# Altium footprint library texas.PCBLIB: 168 footprints (part 8 of 14)
Each footprint in its own frame and in the unit in brackets; x right, y up, seen from the top. Pads: shape width x height; smd on the part's side, far side on the other; paste and mask are expansions set on the pad; w line width, h text height; cw(c..) or ccw(c..) is an arc to the next point about the centre after c.
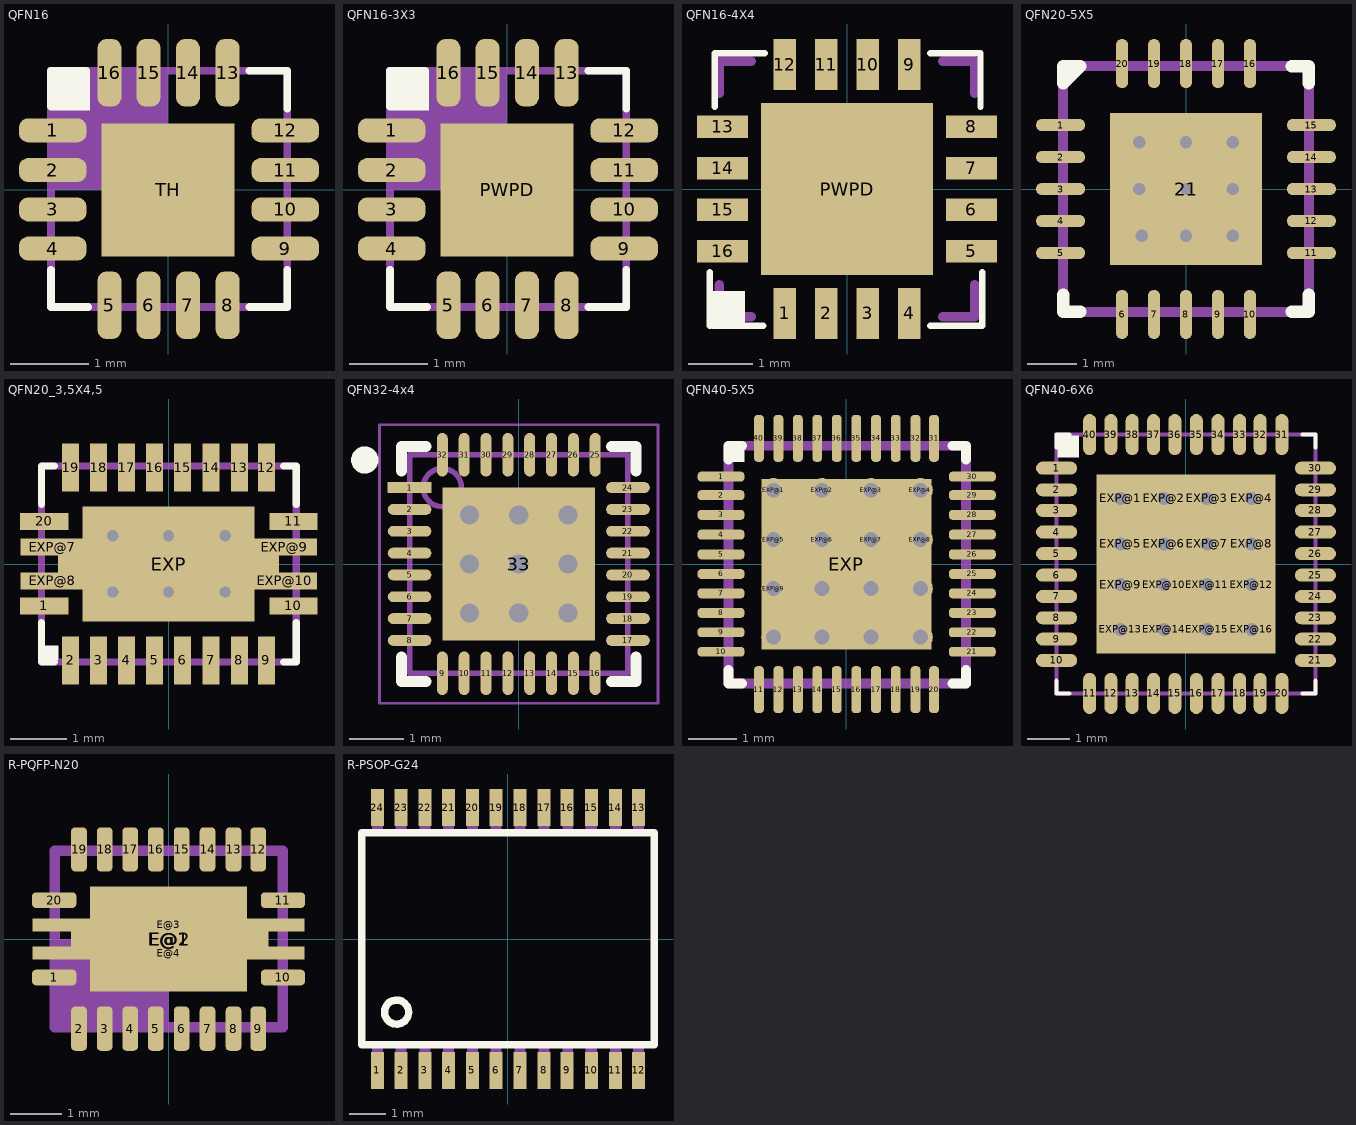
[diagram p7: the footprints below, top view; thin cyan lines are the x and y axes]

## QFN16 [mil]
pads (17):
  rrect75% 34x12 smd: 1(-58.07,30) 2(-58.07,10) 3(-58.07,-9.84) 4(-58.07,-29.53) 9(59,-29.53) 10(59,-9.84) 11(59,10) 12(59,30)
  rrect75% 12x34 smd: 5(-29.53,-58.07) 6(-9.84,-58.07) 7(10,-58.07) 8(30,-58.07) 13(30,59) 14(10,59) 15(-9.84,59) 16(-29.53,59)
  rect 67x67 smd: TH(0,0)
Top Overlay:
  rectangle: -59.06,40 -39.37,60
  lines w4: -59.06,-40.35 -59.06,-59.06 -40.35,-59.06 ; -59.06,42 -59.06,60 -41.34,60 ; 41,-59.06 60,-59.06 60,-40.35 ; 41,60 60,60 60,41
Top Paste:
  circle w0: c-47.24,30 r5
  circle w0: c-47.24,10 r5
  circle w0: c-47.24,-9.84 r5
  circle w0: c-47.24,-29.53 r5
  circle w0: c-29.53,-47.24 r5
  circle w0: c-9.84,-47.24 r5
  circle w0: c10,-47.24 r5
  circle w0: c30,-47.24 r5
  circle w0: c48,-29.53 r5
  circle w0: c48,-9.84 r5
  circle w0: c48,10 r5
  circle w0: c48,30 r5
  circle w0: c30,48 r5
  circle w0: c10,48 r5
  circle w0: c-9.84,48 r5
  circle w0: c-29.53,48 r5
  region: -3.72,4.22 -3.72,31.78 -31.72,31.78 -31.72,4.22
  rectangle: -72.83,25 -47.24,35
  rectangle: -72.83,5 -47.24,15
  rectangle: -72.83,-14.76 -47.24,-4.92
  rectangle: -72.83,-34.45 -47.24,-24.61
  region: -24.61,-72.83 -24.61,-47.24 -34.45,-47.24 -34.45,-72.83
  region: -4.9,-72.86 -4.9,-47.22 -14.74,-47.22 -14.74,-72.86
  region: 14.94,-73.02 14.94,-47.06 5.1,-47.06 5.1,-73.02
  region: 34.92,-73.04 34.92,-47.04 25.08,-47.04 25.08,-73.04
  region: 73,-24.61 48,-24.61 48,-34.45 73,-34.45
  region: 73,-4.92 48,-4.92 48,-14.76 73,-14.76
  region: 73,15 48,15 48,5 73,5
  region: 73,35 48,35 48,25 73,25
  region: 25.5,73.5 25.5,47.5 34.5,47.5 34.5,73.5
  region: 5.52,73.48 5.52,47.52 14.52,47.52 14.52,73.48
  region: -14.32,73.32 -14.32,47.68 -5.32,47.68 -5.32,73.32
  region: -34.03,73.3 -34.03,47.7 -25.03,47.7 -25.03,73.3
  region: -3.94,-3.94 -31.5,-3.94 -31.5,-31.5 -3.94,-31.5
  region: 4.22,-3.72 4.22,-31.72 31.78,-31.72 31.78,-3.72
  rectangle: 4,4 32,32
Top Solder:
  circle w0: c-47.24,30 r8
  circle w0: c-47.24,10 r8
  circle w0: c-47.24,-9.84 r8
  circle w0: c-47.24,-29.53 r8
  circle w0: c-29.53,-47.24 r8
  circle w0: c-9.84,-47.24 r8
  circle w0: c10,-47.24 r8
  circle w0: c30,-47.24 r8
  circle w0: c48,-29.53 r8
  circle w0: c48,-9.84 r8
  circle w0: c48,10 r8
  circle w0: c48,30 r8
  circle w0: c30,48 r8
  circle w0: c10,48 r8
  circle w0: c-9.84,48 r8
  circle w0: c-29.53,48 r8
  rectangle: -34.45,-34.45 35,35
  rectangle: -74.8,22 -47.24,38
  rectangle: -74.8,2 -47.24,18
  rectangle: -74.8,-17.72 -47.24,-1.97
  rectangle: -74.8,-37.4 -47.24,-21.65
  region: -21.65,-74.8 -21.65,-47.24 -37.4,-47.24 -37.4,-74.8
  region: -1.94,-74.83 -1.94,-47.21 -17.68,-47.21 -17.68,-74.83
  region: 17.91,-74.99 17.91,-47.06 2.16,-47.06 2.16,-74.99
  region: 37.87,-75.02 37.87,-47.02 22.13,-47.02 22.13,-75.02
  region: 75,-21.65 48,-21.65 48,-37.4 75,-37.4
  region: 75,-1.97 48,-1.97 48,-17.72 75,-17.72
  region: 75,18 48,18 48,2 75,2
  region: 75,38 48,38 48,22 75,22
  region: 22.5,75.5 22.5,47.5 37.5,47.5 37.5,75.5
  region: 2.53,75.47 2.53,47.53 17.53,47.53 17.53,75.47
  region: -17.31,75.31 -17.31,47.69 -2.31,47.69 -2.31,75.31
  region: -37.03,75.28 -37.03,47.72 -22.03,47.72 -22.03,75.28
Mechanical 4:
  rectangle: -59.06,0 0,60
  lines w4: -59.06,-59.06 60,-59.06 60,60 -59.06,60 -59.06,-59.06
Mechanical 14:
  circle w1: c0,0 r6
  circle w1: c20,20 r6
  circle w1: c20,-19.68 r6
  circle w1: c-19.68,-19.68 r6
  circle w1: c-19.68,20 r6

## QFN16-3X3 [mil]
pads (17):
  rrect75% 34x12 smd: 1(-58.07,30) 2(-58.07,10) 3(-58.07,-9.84) 4(-58.07,-29.53) 9(59,-29.53) 10(59,-9.84) 11(59,10) 12(59,30)
  rrect75% 12x34 smd: 5(-29.53,-58.07) 6(-9.84,-58.07) 7(10,-58.07) 8(30,-58.07) 13(30,59) 14(10,59) 15(-9.84,59) 16(-29.53,59)
  rect 67x67 smd: PWPD(0,0)
Top Overlay:
  rectangle: -59.06,40 -39.37,60
  lines w4: -59.06,-40.35 -59.06,-59.06 -40.35,-59.06 ; -59.06,42 -59.06,60 -41.34,60 ; 41,-59.06 60,-59.06 60,-40.35 ; 41,60 60,60 60,41
Top Paste:
  circle w0: c-29.53,48 r5
  circle w0: c-9.84,48 r5
  circle w0: c10,48 r5
  circle w0: c30,48 r5
  circle w0: c48,30 r5
  circle w0: c48,10 r5
  circle w0: c48,-9.84 r5
  circle w0: c48,-29.53 r5
  circle w0: c30,-47.24 r5
  circle w0: c10,-47.24 r5
  circle w0: c-9.84,-47.24 r5
  circle w0: c-29.53,-47.24 r5
  circle w0: c-47.24,-29.53 r5
  circle w0: c-47.24,-9.84 r5
  circle w0: c-47.24,10 r5
  circle w0: c-47.24,30 r5
  rectangle: 4,4 32,32
  region: 4.22,-3.72 4.22,-31.72 31.78,-31.72 31.78,-3.72
  region: -3.94,-3.94 -31.5,-3.94 -31.5,-31.5 -3.94,-31.5
  region: -34.03,73.3 -34.03,47.7 -25.03,47.7 -25.03,73.3
  region: -14.32,73.32 -14.32,47.68 -5.32,47.68 -5.32,73.32
  region: 5.52,73.48 5.52,47.52 14.52,47.52 14.52,73.48
  region: 25.5,73.5 25.5,47.5 34.5,47.5 34.5,73.5
  region: 73,35 48,35 48,25 73,25
  region: 73,15 48,15 48,5 73,5
  region: 73,-4.92 48,-4.92 48,-14.76 73,-14.76
  region: 73,-24.61 48,-24.61 48,-34.45 73,-34.45
  region: 34.92,-73.04 34.92,-47.04 25.08,-47.04 25.08,-73.04
  region: 14.94,-73.02 14.94,-47.06 5.1,-47.06 5.1,-73.02
  region: -4.9,-72.86 -4.9,-47.22 -14.74,-47.22 -14.74,-72.86
  region: -24.61,-72.83 -24.61,-47.24 -34.45,-47.24 -34.45,-72.83
  rectangle: -72.83,-34.45 -47.24,-24.61
  rectangle: -72.83,-14.76 -47.24,-4.92
  rectangle: -72.83,5 -47.24,15
  rectangle: -72.83,25 -47.24,35
  region: -3.72,4.22 -3.72,31.78 -31.72,31.78 -31.72,4.22
Top Solder:
  circle w0: c-29.53,48 r8
  circle w0: c-9.84,48 r8
  circle w0: c10,48 r8
  circle w0: c30,48 r8
  circle w0: c48,30 r8
  circle w0: c48,10 r8
  circle w0: c48,-9.84 r8
  circle w0: c48,-29.53 r8
  circle w0: c30,-47.24 r8
  circle w0: c10,-47.24 r8
  circle w0: c-9.84,-47.24 r8
  circle w0: c-29.53,-47.24 r8
  circle w0: c-47.24,-29.53 r8
  circle w0: c-47.24,-9.84 r8
  circle w0: c-47.24,10 r8
  circle w0: c-47.24,30 r8
  region: -37.03,75.28 -37.03,47.72 -22.03,47.72 -22.03,75.28
  region: -17.31,75.31 -17.31,47.69 -2.31,47.69 -2.31,75.31
  region: 2.53,75.47 2.53,47.53 17.53,47.53 17.53,75.47
  region: 22.5,75.5 22.5,47.5 37.5,47.5 37.5,75.5
  region: 75,38 48,38 48,22 75,22
  region: 75,18 48,18 48,2 75,2
  region: 75,-1.97 48,-1.97 48,-17.72 75,-17.72
  region: 75,-21.65 48,-21.65 48,-37.4 75,-37.4
  region: 37.87,-75.02 37.87,-47.02 22.13,-47.02 22.13,-75.02
  region: 17.91,-74.99 17.91,-47.06 2.16,-47.06 2.16,-74.99
  region: -1.94,-74.83 -1.94,-47.21 -17.68,-47.21 -17.68,-74.83
  region: -21.65,-74.8 -21.65,-47.24 -37.4,-47.24 -37.4,-74.8
  rectangle: -74.8,-37.4 -47.24,-21.65
  rectangle: -74.8,-17.72 -47.24,-1.97
  rectangle: -74.8,2 -47.24,18
  rectangle: -74.8,22 -47.24,38
  rectangle: -34.45,-34.45 35,35
Mechanical 4:
  rectangle: -59.06,0 0,60
  lines w4: -59.06,-59.06 -59.06,60 60,60 60,-59.06 -59.06,-59.06
Mechanical 14:
  circle w1: c-19.68,20 r6
  circle w1: c-19.68,-19.68 r6
  circle w1: c20,-19.68 r6
  circle w1: c20,20 r6
  circle w1: c0,0 r6
3D body "ALSRobot-QFN16 3x3.STEP": height 35.43, standoff 0, extent -60.99,-59.87 58.77,59.89

## QFN16-4X4 [mil]
pads (17):
  rrect2% 13.78x31.5 smd: 1(-38.39,-76.77) 2(-12.8,-76.77) 3(12.8,-76.77) 4(38.39,-76.77) 9(38.39,76.77) 10(12.8,76.77) 11(-12.8,76.77) 12(-38.39,76.77)
  rrect2% 31.5x13.78 smd: 5(76.77,-38.39) 6(76.77,-12.8) 7(76.77,12.8) 8(76.77,38.39) 13(-76.77,38.39) 14(-76.77,12.8) 15(-76.77,-12.8) 16(-76.77,-38.39)
  rect 106.3x106.3 smd: PWPD(0,0)
Top Overlay:
  region: -62.99,-82.68 -82.68,-82.68 -82.68,-62.99 -62.99,-62.99
  lines w4: -84.66,-84.23 -84.66,-51.23 ; -82.66,-84.23 -51.66,-84.23 ; -81.66,50.77 -81.66,83.77 -50.66,83.77 ; 51.34,-84.23 82.34,-84.23 ; 51.34,83.77 82.34,83.77 82.34,50.77 ; 83.34,-84.23 83.34,-51.23
Top Paste:
  region: 47.24,-47.24 47.24,47.24 -47.24,47.24 -47.24,-39.37 -39.37,-47.24
Top Solder:
  region: 47.24,-47.24 47.24,47.24 -47.24,47.24 -47.24,-39.37 -39.37,-47.24
Mechanical 4:
  region: -62.99,-82.68 -82.68,-82.68 -82.68,-62.99 -62.99,-62.99
  lines w6: -78.74,-68.9 -78.74,-59.06 ; -78.74,59.06 -78.74,78.74 -59.06,78.74 ; -68.9,-78.74 -59.06,-78.74 ; 59.06,-78.74 78.74,-78.74 78.74,-59.06 ; 59.06,78.74 78.74,78.74 78.74,59.06
3D body "ALSRobot-QFN16 4x4.step": height 36.22, standoff 0, extent -78.74,-78.73 78.73,78.75

## QFN20-5X5 [mm]
pads (21):
  oval 1x0.25 smd: 1(-2.55,1.3) 2(-2.55,0.65) 3(-2.55,0) 4(-2.55,-0.65) 5(-2.55,-1.3) 11(2.55,-1.3) 12(2.55,-0.65) 13(2.55,0) 14(2.55,0.65) 15(2.55,1.3)
  oval 0.25x1 smd: 6(-1.3,-2.55) 7(-0.65,-2.55) 8(0,-2.55) 9(0.65,-2.55) 10(1.3,-2.55) 16(1.3,2.55) 17(0.65,2.55) 18(0,2.55) 19(-0.65,2.55) 20(-1.3,2.55)
  rect 3.1x3.1 smd: 21(0,0)
via -0.9,-0.95 diameter 0.508 hole 0.254
via -0.95,0 diameter 0.508 hole 0.254
via 0,-0.95 diameter 0.508 hole 0.254
via 0,0 diameter 0.508 hole 0.254
via 0.95,0 diameter 0.508 hole 0.254
via 0.95,-0.95 diameter 0.508 hole 0.254
via 0,0.95 diameter 0.508 hole 0.254
via 0.95,0.95 diameter 0.508 hole 0.254
via -0.95,0.95 diameter 0.508 hole 0.254
Top Overlay:
  lines w0.254: -2.5,-2.15 -2.5,-2.5 -2.15,-2.5 ; 2.15,-2.5 2.5,-2.5 2.5,-2.15 ; 2.15,2.5 2.5,2.5 2.5,2.15 ; -2.5,2.15 -2.5,2.5 -2.15,2.5 -2.5,2.15
Mechanical 4:
  lines w0.203: -2.5,-2.5 2.5,-2.5 2.5,2.5 -2.5,2.5 -2.5,-2.5
3D body "User Library-PQFN_20_5x5.step": height 0.87, standoff -0.03, extent -2.5,-2.5 2.5,2.5

## QFN20_3,5X4,5 [mil]
pads (33):
  rect 34x12 smd: 1(-87.6,-29.53) 10(88,-29.53) 11(88,30) 20(-87.6,30)
  rect 12x34 smd: 2(-68.9,-67.91) 3(-49.21,-67.91) 4(-29.53,-67.91) 5(-9.84,-67.91) 6(10,-67.91) 7(30,-67.91) 8(50,-67.91) 9(69,-67.91) 12(69,68) 13(50,68) 14(30,68) 15(10,68) 16(-9.84,68) 17(-29.53,68) 18(-49.21,68) 19(-68.9,68)
  rect 121x81 smd: EXP(0,0)
  round 12 hole 8: EXP@1(-39.37,20) EXP@2(0,20) EXP@3(40,20) EXP@4(-39.37,-19.68) EXP@5(0,-19.68) EXP@6(40,-19.68)
  rect 45x12 smd: EXP@7(-81.69,12) EXP@8(-81.69,-11.81) EXP@9(82,12) EXP@10(82,-11.81)
  rect 18x16 smd: EXP@11(-68.9,0) EXP@12(69,0)
Top Overlay:
  rectangle: -87.5,-67.5 -77.5,-57.5
  lines w5: -89.57,-41.1 -89.57,-68.9 -80.43,-68.9 ; -89.57,42 -89.57,69 -80.43,69 ; 81,-68.9 90,-68.9 90,-41.1 ; 81,69 90,69 90,42
Top Paste:
  circle w0: c-68.9,58 r5
  circle w0: c-49.21,58 r5
  circle w0: c-29.53,58 r5
  circle w0: c-9.84,58 r5
  circle w0: c10,58 r5
  circle w0: c30,58 r5
  circle w0: c50,58 r5
  circle w0: c69,58 r5
  circle w0: c-76.77,30 r5
  circle w0: c77,30 r5
  circle w0: c77,-29.53 r5
  circle w0: c-76.77,-29.53 r5
  circle w0: c69,-57.09 r5
  circle w0: c50,-57.09 r5
  circle w0: c30,-57.09 r5
  circle w0: c10,-57.09 r5
  circle w0: c-9.84,-57.09 r5
  circle w0: c-29.53,-57.09 r5
  circle w0: c-49.21,-57.09 r5
  circle w0: c-68.9,-57.09 r5
  rectangle: -57.87,-38.39 -5.91,-5.91
  rectangle: -57.87,6 -5.91,39
  region: 58,-5.91 6,-5.91 6,-38.39 58,-38.39
  region: 58,39 6,39 6,6 58,6
  rectangle: -73.33,58 -64.47,84
  rectangle: -53.64,58 -44.78,84
  rectangle: -33.96,58 -25.1,84
  rectangle: -14.27,58 -5.41,84
  rectangle: 6,58 15,84
  rectangle: 26,58 34,84
  rectangle: 45,58 54,84
  rectangle: 65,58 74,84
  region: -77.06,25.57 -77.06,34.43 -103.06,34.43 -103.06,25.57
  region: 77.5,34.5 77.5,25.5 103.5,25.5 103.5,34.5
  region: 77.21,-25.03 77.21,-34.03 103.79,-34.03 103.79,-25.03
  region: -76.77,-33.96 -76.77,-25.1 -103.35,-25.1 -103.35,-33.96
  region: 74,-57.09 65,-57.09 65,-83.66 74,-83.66
  region: 54,-57.09 45,-57.09 45,-83.66 54,-83.66
  region: 34,-57.09 26,-57.09 26,-83.66 34,-83.66
  region: 15,-57.09 6,-57.09 6,-83.66 15,-83.66
  region: -5.41,-57.09 -14.27,-57.09 -14.27,-83.66 -5.41,-83.66
  region: -25.1,-57.09 -33.96,-57.09 -33.96,-83.66 -25.1,-83.66
  region: -44.78,-57.09 -53.64,-57.09 -53.64,-83.66 -44.78,-83.66
  region: -64.47,-57.09 -73.33,-57.09 -73.33,-83.66 -64.47,-83.66
  region: 104,-7.19 68,-7.18 68,-16.24 104,-16.24
  rectangle: -103.35,-16.24 -67.91,-7.18
  rectangle: -103.35,8 -67.91,17
  region: 104,17 68,17 68,8 104,8
Top Solder:
  circle w0: c-76.77,30 r7
  circle w0: c-68.9,58 r7
  circle w0: c-49.21,58 r7
  circle w0: c-29.53,58 r7
  circle w0: c-9.84,58 r7
  circle w0: c10,58 r7
  circle w0: c30,58 r7
  circle w0: c50,58 r7
  circle w0: c69,58 r7
  circle w0: c77,30 r7
  circle w0: c-76.77,-29.53 r7
  circle w0: c77,-29.53 r7
  circle w0: c69,-57.09 r7
  circle w0: c50,-57.09 r7
  circle w0: c30,-57.09 r7
  circle w0: c10,-57.09 r7
  circle w0: c-9.84,-57.09 r7
  circle w0: c-29.53,-57.09 r7
  circle w0: c-49.21,-57.09 r7
  circle w0: c-68.9,-57.09 r7
  rectangle: -105.31,24 -76.77,36
  region: 105,19 67,19 67,6 105,6
  rectangle: -104.82,6 -66.44,19
  rectangle: -104.82,-18.21 -66.44,-5.41
  region: 105,-5.41 67,-5.41 67,-18.21 105,-18.21
  rectangle: -61.02,-41.34 62,42
  region: -75.4,85.77 -75.4,57.23 -62.4,57.23 -62.4,85.77
  region: -55.71,85.77 -55.71,57.23 -42.71,57.23 -42.71,85.77
  region: -36.03,85.77 -36.03,57.23 -23.03,57.23 -23.03,85.77
  region: -16.06,86.06 -16.06,56.94 -3.06,56.94 -3.06,86.06
  region: 3.79,86.21 3.79,56.79 16.79,56.79 16.79,86.21
  region: 23.5,85.5 23.5,57.5 36.5,57.5 36.5,85.5
  region: 43,86 43,57 56,57 56,86
  region: 63,86 63,57 76,57 76,86
  region: 106,36 77,36 77,24 106,24
  rectangle: -105.31,-35.93 -76.77,-23.13
  region: 106,-23.13 77,-23.13 77,-35.93 106,-35.93
  region: 75.9,-85.86 75.9,-56.86 63.1,-56.86 63.1,-85.86
  region: 55.9,-85.86 55.9,-56.86 43.1,-56.86 43.1,-85.86
  region: 36.4,-85.36 36.4,-57.36 23.6,-57.36 23.6,-85.36
  region: 16.68,-86.07 16.68,-56.64 3.89,-56.64 3.89,-86.07
  region: -3.16,-85.92 -3.16,-56.8 -15.95,-56.8 -15.95,-85.92
  region: -23.13,-85.63 -23.13,-57.09 -35.93,-57.09 -35.93,-85.63
  region: -42.81,-85.63 -42.81,-57.09 -55.61,-57.09 -55.61,-85.63
  region: -62.5,-85.63 -62.5,-57.09 -75.3,-57.09 -75.3,-85.63
Mechanical 4:
  lines w5: -89.57,-68.9 90,-68.9 90,69 -89.57,69 -89.57,-68.9

## QFN32-4x4 [mm] "QFN, 32-Leads, Body 4x4mm, Pitch 0.5mm, Thermal Pad 3.45x3.45mm, IPC Medium Density"
height 1
pads (33):
  rect 0.8x0.2 smd: 1(-2,1.4)
  oval 0.8x0.2 smd: 2(-2,1) 3(-2,0.6) 4(-2,0.2) 5(-2,-0.2) 6(-2,-0.6) 7(-2,-1) 8(-2,-1.4) 17(2,-1.4) 18(2,-1) 19(2,-0.6) 20(2,-0.2) 21(2,0.2) 22(2,0.6) 23(2,1) 24(2,1.4)
  oval 0.2x0.8 smd: 9(-1.4,-2) 10(-1,-2) 11(-0.6,-2) 12(-0.2,-2) 13(0.2,-2) 14(0.6,-2) 15(1,-2) 16(1.4,-2) 25(1.4,2) 26(1,2) 27(0.6,2) 28(0.2,2) 29(-0.2,2) 30(-0.6,2) 31(-1,2) 32(-1.4,2)
  rect 2.8x2.8 smd: 33(0,0)
via 0,0 diameter 0.5 hole 0.35
via -0.9,0.9 diameter 0.5 hole 0.35
via 0,0.9 diameter 0.5 hole 0.35
via 0.9,0.9 diameter 0.5 hole 0.35
via -0.9,0 diameter 0.5 hole 0.35
via 0.9,0 diameter 0.5 hole 0.35
via -0.9,-0.9 diameter 0.5 hole 0.35
via 0,-0.9 diameter 0.5 hole 0.35
via 0.9,-0.9 diameter 0.5 hole 0.35
Top Overlay:
  circle w0.25: c-2.819,1.905 r0.125
  lines w0.2: -2.15,-1.7 -2.15,-2.15 -1.7,-2.15 ; -2.15,1.7 -2.15,2.15 -1.7,2.15 ; 1.7,-2.15 2.15,-2.15 2.15,-1.7 ; 1.7,2.15 2.15,2.15 2.15,1.7
Mechanical 13:
  circle w0.1: c-1.4,1.4 r0.35
  lines w0.1: -2,-2 -2,2 2,2 2,-2 -2,-2
Mechanical 15:
  lines w0.05: -2.55,-2.55 -2.55,2.55 2.55,2.55 2.55,-2.55 -2.55,-2.55
  lines w0.1: -0.5,0 0.5,0 ; 0,-0.5 0,0.5
3D body: height 1, standoff 0, extent -2,-2 2,2

## QFN40-5X5 [mil]
pads (57):
  rrect75% 38x8 smd: 1(-101.57,71) 2(-101.57,56) 3(-101.57,40) 4(-101.57,24) 5(-101.57,8) 6(-101.57,-7.87) 7(-101.57,-23.62) 8(-101.57,-39.37) 9(-101.57,-55.12) 10(-101.57,-70.87) 21(102,-70.87) 22(102,-55.12) 23(102,-39.37) 24(102,-23.62) 25(102,-7.87) 26(102,8) 27(102,24) 28(102,40) 29(102,56) 30(102,71)
  rrect75% 8x38 smd: 11(-70.87,-101.57) 12(-55.12,-101.57) 13(-39.37,-101.57) 14(-23.62,-101.57) 15(-7.87,-101.57) 16(8,-101.57) 17(24,-101.57) 18(40,-101.57) 19(56,-101.57) 20(71,-101.57) 31(71,102) 32(56,102) 33(40,102) 34(24,102) 35(8,102) 36(-7.87,102) 37(-23.62,102) 38(-39.37,102) 39(-55.12,102) 40(-70.87,102)
  rect 138x138 smd: EXP(0,0)
  round 20 hole 12: EXP@1(-59.06,60) EXP@2(-19.68,60) EXP@3(20,60) EXP@4(60,60) EXP@5(-59.06,20) EXP@6(-19.68,20) EXP@7(20,20) EXP@8(60,20) EXP@9(-59.06,-19.68) EXP@10(-19.68,-19.68) EXP@11(20,-19.68) EXP@12(60,-19.68) EXP@13(-59.06,-59.06) EXP@14(-19.68,-59.06) EXP@15(20,-59.06) EXP@16(60,-59.06)
Top Overlay:
  rectangle: -98.43,83 -82.68,99
  lines w8: -95.47,-85.63 -95.47,-96.46 -84.65,-96.46 ; -95.47,85 -95.47,96 -84.65,96 ; 86,-96.46 97,-96.46 97,-85.63 ; 86,96 97,96 97,85
Top Paste:
  rectangle: -118.11,68 -85.63,74
  rectangle: -118.11,53 -85.63,59
  rectangle: -118.11,37 -85.63,43
  rectangle: -118.11,21 -85.63,27
  rectangle: -118.11,5 -85.63,11
  rectangle: -118.11,-10.83 -85.63,-4.92
  rectangle: -118.11,-26.57 -85.63,-20.67
  rectangle: -118.11,-42.32 -85.63,-36.42
  rectangle: -118.11,-58.07 -85.63,-52.17
  rectangle: -118.11,-73.82 -85.63,-67.91
  region: -67.91,-118.11 -67.91,-85.63 -73.82,-85.63 -73.82,-118.11
  region: -52.17,-118.11 -52.17,-85.63 -58.07,-85.63 -58.07,-118.11
  region: -36.42,-118.11 -36.42,-85.63 -42.32,-85.63 -42.32,-118.11
  region: -20.67,-118.11 -20.67,-85.63 -26.57,-85.63 -26.57,-118.11
  region: -4.6,-118.43 -4.6,-85.31 -10.51,-85.31 -10.51,-118.43
  region: 11.27,-118.55 11.27,-85.19 5.36,-85.19 5.36,-118.55
  region: 26.95,-117.87 26.95,-85.87 21.05,-85.87 21.05,-117.87
  region: 42.95,-117.87 42.95,-85.87 37.05,-85.87 37.05,-117.87
  region: 58.45,-118.37 58.45,-85.37 52.55,-85.37 52.55,-118.37
  region: 74.45,-118.37 74.45,-85.37 68.55,-85.37 68.55,-118.37
  region: 119,-67.91 86,-67.91 86,-73.82 119,-73.82
  region: 119,-52.17 86,-52.17 86,-58.07 119,-58.07
  region: 119,-36.42 86,-36.42 86,-42.32 119,-42.32
  region: 119,-20.67 86,-20.67 86,-26.57 119,-26.57
  region: 119,-4.92 86,-4.92 86,-10.83 119,-10.83
  region: 119,11 86,11 86,5 119,5
  region: 119,27 86,27 86,21 119,21
  region: 119,43 86,43 86,37 119,37
  region: 119,59 86,59 86,53 119,53
  region: 119,74 86,74 86,68 119,68
  region: 68.5,118.5 68.5,85.5 74.5,85.5 74.5,118.5
  region: 52.5,118.5 52.5,85.5 58.5,85.5 58.5,118.5
  region: 37,118 37,86 43,86 43,118
  region: 21,118 21,86 27,86 27,118
  region: 5.32,118.68 5.32,85.32 11.32,85.32 11.32,118.68
  region: -10.56,118.56 -10.56,85.44 -4.56,85.44 -4.56,118.56
  region: -26.62,118.24 -26.62,85.76 -20.62,85.76 -20.62,118.24
  region: -42.37,118.24 -42.37,85.76 -36.37,85.76 -36.37,118.24
  region: -58.12,118.24 -58.12,85.76 -52.12,85.76 -52.12,118.24
  region: -73.87,118.24 -73.87,85.76 -67.87,85.76 -67.87,118.24
  rectangle: -64.96,6 -5.91,65
  rectangle: 6,6 65,65
  rectangle: -64.96,-64.96 -5.91,-5.91
  rectangle: 6,-64.96 65,-5.91
Top Solder:
  rectangle: -121.06,66 -81.69,76
  rectangle: -121.06,51 -81.69,61
  rectangle: -121.06,35 -81.69,45
  rectangle: -121.06,19 -81.69,29
  rectangle: -121.06,3 -81.69,13
  rectangle: -121.06,-12.8 -81.69,-2.95
  rectangle: -121.06,-28.54 -81.69,-18.7
  rectangle: -121.06,-44.29 -81.69,-34.45
  rectangle: -121.06,-60.04 -81.69,-50.2
  rectangle: -121.06,-75.79 -81.69,-65.94
  region: -65.94,-121.06 -65.94,-81.69 -75.79,-81.69 -75.79,-121.06
  region: -50.2,-121.06 -50.2,-81.69 -60.04,-81.69 -60.04,-121.06
  region: -34.45,-121.06 -34.45,-81.69 -44.29,-81.69 -44.29,-121.06
  region: -18.7,-121.06 -18.7,-81.69 -28.54,-81.69 -28.54,-121.06
  region: -2.86,-121.16 -2.86,-81.6 -12.7,-81.6 -12.7,-121.16
  region: 13.02,-121.28 13.02,-81.47 3.17,-81.47 3.17,-121.28
  region: 28.92,-121.38 28.92,-81.38 19.08,-81.38 19.08,-121.38
  region: 44.92,-121.38 44.92,-81.38 35.08,-81.38 35.08,-121.38
  region: 60.42,-120.88 60.42,-81.88 50.58,-81.88 50.58,-120.88
  region: 76.42,-120.88 76.42,-81.88 66.58,-81.88 66.58,-120.88
  region: 122,-65.94 82,-65.94 82,-75.79 122,-75.79
  region: 122,-50.2 82,-50.2 82,-60.04 122,-60.04
  region: 122,-34.45 82,-34.45 82,-44.29 122,-44.29
  region: 122,-18.7 82,-18.7 82,-28.54 122,-28.54
  region: 122,-2.95 82,-2.95 82,-12.8 122,-12.8
  region: 122,13 82,13 82,3 122,3
  region: 122,29 82,29 82,19 122,19
  region: 122,45 82,45 82,35 122,35
  region: 122,61 82,61 82,51 122,51
  region: 122,76 82,76 82,66 122,66
  region: 66.5,121.5 66.5,82.5 76.5,82.5 76.5,121.5
  region: 50.5,121.5 50.5,82.5 60.5,82.5 60.5,121.5
  region: 35,122 35,82 45,82 45,122
  region: 19,122 19,82 29,82 29,122
  region: 3.09,121.91 3.09,82.09 13.09,82.09 13.09,121.91
  region: -12.78,121.78 -12.78,82.22 -2.78,82.22 -2.78,121.78
  region: -28.62,121.69 -28.62,82.31 -18.62,82.31 -18.62,121.69
  region: -44.37,121.69 -44.37,82.31 -34.37,82.31 -34.37,121.69
  region: -60.12,121.69 -60.12,82.31 -50.12,82.31 -50.12,121.69
  region: -75.87,121.69 -75.87,82.31 -65.87,82.31 -65.87,121.69
  rectangle: -70.87,-70.87 71,71
Mechanical 4:
  lines w8: -95.47,-96.46 97,-96.46 97,96 -95.47,96 -95.47,-96.46

## QFN40-6X6 [mil]
pads (56):
  rrect100% 38x12 smd: 1(-119.09,89) 2(-119.09,69) 3(-119.09,50) 4(-119.09,30) 5(-119.09,10) 6(-119.09,-9.84) 7(-119.09,-29.53) 8(-119.09,-49.21) 9(-119.09,-68.9) 10(-119.09,-88.58) 21(120,-88.58) 22(120,-68.9) 23(120,-49.21) 24(120,-29.53) 25(120,-9.84) 26(120,10) 27(120,30) 28(120,50) 29(120,69) 30(120,89)
  rrect100% 12x38 smd: 11(-88.58,-119.09) 12(-68.9,-119.09) 13(-49.21,-119.09) 14(-29.53,-119.09) 15(-9.84,-119.09) 16(10,-119.09) 17(30,-119.09) 18(50,-119.09) 19(69,-119.09) 20(89,-119.09) 31(89,120) 32(69,120) 33(50,120) 34(30,120) 35(10,120) 36(-9.84,120) 37(-29.53,120) 38(-49.21,120) 39(-68.9,120) 40(-88.58,120)
  rect 44x44 hole 12: EXP@1(-60.04,61) EXP@2(-19.68,61) EXP@3(20,61) EXP@4(61,61) EXP@5(-60.04,19) EXP@6(-19.68,19) EXP@7(20,19) EXP@8(61,19) EXP@9(-60.04,-18.7) EXP@10(-19.68,-18.7) EXP@11(20,-18.7) EXP@12(61,-18.7) EXP@13(-60.04,-60.04) EXP@14(-19.68,-60.04) EXP@15(20,-60.04) EXP@16(61,-60.04)
Top Layer:
  rectangle: -118.11,109 -108.27,119
Top Overlay:
  rectangle: -118.11,99 -98.43,119
  lines w4: -119.09,-107.28 -119.09,-119.09 -107.28,-119.09 ; -119.09,108 -119.09,120 -107.28,120 ; 108,-119.09 120,-119.09 120,-107.28 ; 108,120 120,120 120,108
Top Paste:
  circle w0: c-88.58,107 r5
  circle w0: c-68.9,107 r5
  circle w0: c-49.21,107 r5
  circle w0: c-29.53,107 r5
  circle w0: c-9.84,107 r5
  circle w0: c10,107 r5
  circle w0: c30,107 r5
  circle w0: c50,107 r5
  circle w0: c69,107 r5
  circle w0: c89,107 r5
  circle w0: c107,89 r5
  circle w0: c107,69 r5
  circle w0: c107,50 r5
  circle w0: c107,30 r5
  circle w0: c107,10 r5
  circle w0: c107,-9.84 r5
  circle w0: c107,-29.53 r5
  circle w0: c107,-49.21 r5
  circle w0: c107,-68.9 r5
  circle w0: c107,-88.58 r5
  circle w0: c89,-106.3 r5
  circle w0: c69,-106.3 r5
  circle w0: c50,-106.3 r5
  circle w0: c30,-106.3 r5
  circle w0: c10,-106.3 r5
  circle w0: c-9.84,-106.3 r5
  circle w0: c-29.53,-106.3 r5
  circle w0: c-49.21,-106.3 r5
  circle w0: c-68.9,-106.3 r5
  circle w0: c-88.58,-106.3 r5
  circle w0: c-106.3,-88.58 r5
  circle w0: c-106.3,-68.9 r5
  circle w0: c-106.3,-49.21 r5
  circle w0: c-106.3,-29.53 r5
  circle w0: c-106.3,-9.84 r5
  circle w0: c-106.3,10 r5
  circle w0: c-106.3,30 r5
  circle w0: c-106.3,50 r5
  circle w0: c-106.3,69 r5
  circle w0: c-106.3,89 r5
  rectangle: 37,-77.76 78,-36.42
  rectangle: -20.67,-77.76 21,-36.42
  rectangle: -77.76,-77.76 -36.42,-36.42
  rectangle: 37,-20.67 78,21
  rectangle: -20.67,-20.67 21,21
  rectangle: -77.76,-20.67 -36.42,21
  rectangle: 37,37 78,78
  rectangle: -20.67,37 21,78
  rectangle: -77.76,37 -36.42,78
  region: -93.58,133.29 -93.58,106.71 -83.58,106.71 -83.58,133.29
  region: -73.9,133.29 -73.9,106.71 -63.9,106.71 -63.9,133.29
  region: -54.21,133.29 -54.21,106.71 -44.21,106.71 -44.21,133.29
  region: -34.53,133.29 -34.53,106.71 -24.53,106.71 -24.53,133.29
  region: -14.56,133.56 -14.56,106.44 -4.56,106.44 -4.56,133.56
  region: 5.28,133.72 5.28,106.28 15.28,106.28 15.28,133.72
  region: 25,133 25,107 35,107 35,133
  region: 44.5,133.5 44.5,106.5 54.5,106.5 54.5,133.5
  region: 64.5,133.5 64.5,106.5 74.5,106.5 74.5,133.5
  region: 84,133 84,107 94,107 94,133
  region: 133,94 107,94 107,84 133,84
  region: 133,74 107,74 107,64 133,64
  region: 133,55 107,55 107,45 133,45
  region: 133,35 107,35 107,25 133,25
  region: 133,15 107,15 107,5 133,5
  region: 133,-4.92 107,-4.92 107,-14.76 133,-14.76
  region: 133,-24.61 107,-24.61 107,-34.45 133,-34.45
  region: 133,-44.29 107,-44.29 107,-54.13 133,-54.13
  region: 133,-63.98 107,-63.98 107,-73.82 133,-73.82
  region: 133,-83.66 107,-83.66 107,-93.5 133,-93.5
  region: 93.92,-132.59 93.92,-106.59 84.08,-106.59 84.08,-132.59
  region: 74.42,-133.09 74.42,-106.09 64.58,-106.09 64.58,-133.09
  region: 54.42,-133.09 54.42,-106.09 44.58,-106.09 44.58,-133.09
  region: 34.92,-132.59 34.92,-106.59 25.08,-106.59 25.08,-132.59
  region: 15.2,-133.31 15.2,-105.86 5.36,-105.86 5.36,-133.31
  region: -4.64,-133.15 -4.64,-106.02 -14.49,-106.02 -14.49,-133.15
  region: -24.61,-132.87 -24.61,-106.3 -34.45,-106.3 -34.45,-132.87
  region: -44.29,-132.87 -44.29,-106.3 -54.13,-106.3 -54.13,-132.87
  region: -63.98,-132.87 -63.98,-106.3 -73.82,-106.3 -73.82,-132.87
  region: -83.66,-132.87 -83.66,-106.3 -93.5,-106.3 -93.5,-132.87
  rectangle: -132.87,-93.5 -106.3,-83.66
  rectangle: -132.87,-73.82 -106.3,-63.98
  rectangle: -132.87,-54.13 -106.3,-44.29
  rectangle: -132.87,-34.45 -106.3,-24.61
  rectangle: -132.87,-14.76 -106.3,-4.92
  rectangle: -132.87,5 -106.3,15
  rectangle: -132.87,25 -106.3,35
  rectangle: -132.87,45 -106.3,55
  rectangle: -132.87,64 -106.3,74
  rectangle: -132.87,84 -106.3,94
Top Solder:
  circle w0: c-88.58,107 r8
  circle w0: c-68.9,107 r8
  circle w0: c-49.21,107 r8
  circle w0: c-29.53,107 r8
  circle w0: c-9.84,107 r8
  circle w0: c10,107 r8
  circle w0: c30,107 r8
  circle w0: c50,107 r8
  circle w0: c69,107 r8
  circle w0: c89,107 r8
  circle w0: c107,89 r8
  circle w0: c107,69 r8
  circle w0: c107,50 r8
  circle w0: c107,30 r8
  circle w0: c107,10 r8
  circle w0: c107,-9.84 r8
  circle w0: c107,-29.53 r8
  circle w0: c107,-49.21 r8
  circle w0: c107,-68.9 r8
  circle w0: c107,-88.58 r8
  circle w0: c89,-106.3 r8
  circle w0: c69,-106.3 r8
  circle w0: c50,-106.3 r8
  circle w0: c30,-106.3 r8
  circle w0: c10,-106.3 r8
  circle w0: c-9.84,-106.3 r8
  circle w0: c-29.53,-106.3 r8
  circle w0: c-49.21,-106.3 r8
  circle w0: c-68.9,-106.3 r8
  circle w0: c-88.58,-106.3 r8
  circle w0: c-106.3,-88.58 r8
  circle w0: c-106.3,-68.9 r8
  circle w0: c-106.3,-49.21 r8
  circle w0: c-106.3,-29.53 r8
  circle w0: c-106.3,-9.84 r8
  circle w0: c-106.3,10 r8
  circle w0: c-106.3,30 r8
  circle w0: c-106.3,50 r8
  circle w0: c-106.3,69 r8
  circle w0: c-106.3,89 r8
  rectangle: 35,-79.72 80,-34.45
  rectangle: -22.64,-79.72 23,-34.45
  rectangle: -79.72,-79.72 -34.45,-34.45
  rectangle: 35,-22.64 80,23
  rectangle: -22.64,-22.64 23,23
  rectangle: -79.72,-22.64 -34.45,23
  rectangle: 35,35 80,80
  rectangle: -22.64,35 23,80
  rectangle: -79.72,35 -34.45,80
  region: -96.08,134.28 -96.08,106.72 -81.08,106.72 -81.08,134.28
  region: -76.4,134.28 -76.4,106.72 -61.4,106.72 -61.4,134.28
  region: -56.71,134.28 -56.71,106.72 -41.71,106.72 -41.71,134.28
  region: -37.03,134.28 -37.03,106.72 -22.03,106.72 -22.03,134.28
  region: -17.31,134.31 -17.31,106.69 -2.31,106.69 -2.31,134.31
  region: 2.53,134.47 2.53,106.53 17.53,106.53 17.53,134.47
  region: 22.5,134.5 22.5,106.5 37.5,106.5 37.5,134.5
  region: 42,134 42,107 57,107 57,134
  region: 62,134 62,107 77,107 77,134
  region: 81.5,134.5 81.5,106.5 96.5,106.5 96.5,134.5
  region: 134,97 107,97 107,81 134,81
  region: 134,77 107,77 107,62 134,62
  region: 134,58 107,58 107,42 134,42
  region: 134,38 107,38 107,22 134,22
  region: 134,18 107,18 107,2 134,2
  region: 134,-1.97 107,-1.97 107,-17.72 134,-17.72
  region: 134,-21.65 107,-21.65 107,-37.4 134,-37.4
  region: 134,-41.34 107,-41.34 107,-57.09 134,-57.09
  region: 134,-61.02 107,-61.02 107,-76.77 134,-76.77
  region: 134,-80.71 107,-80.71 107,-96.46 134,-96.46
  region: 96.87,-134.08 96.87,-106.08 81.13,-106.08 81.13,-134.08
  region: 77.37,-133.58 77.37,-106.58 61.63,-106.58 61.63,-133.58
  region: 57.37,-133.58 57.37,-106.58 41.63,-106.58 41.63,-133.58
  region: 37.87,-134.08 37.87,-106.08 22.13,-106.08 22.13,-134.08
  region: 17.91,-134.05 17.91,-106.11 2.16,-106.11 2.16,-134.05
  region: -1.94,-133.89 -1.94,-106.27 -17.69,-106.27 -17.69,-133.89
  region: -21.65,-133.86 -21.65,-106.3 -37.4,-106.3 -37.4,-133.86
  region: -41.34,-133.86 -41.34,-106.3 -57.09,-106.3 -57.09,-133.86
  region: -61.02,-133.86 -61.02,-106.3 -76.77,-106.3 -76.77,-133.86
  region: -80.71,-133.86 -80.71,-106.3 -96.46,-106.3 -96.46,-133.86
  rectangle: -133.86,-96.46 -106.3,-80.71
  rectangle: -133.86,-76.77 -106.3,-61.02
  rectangle: -133.86,-57.09 -106.3,-41.34
  rectangle: -133.86,-37.4 -106.3,-21.65
  rectangle: -133.86,-17.72 -106.3,-1.97
  rectangle: -133.86,2 -106.3,18
  rectangle: -133.86,22 -106.3,38
  rectangle: -133.86,42 -106.3,58
  rectangle: -133.86,62 -106.3,77
  rectangle: -133.86,81 -106.3,97
Mechanical 4:
  lines w4: -119.09,-119.09 -119.09,120 120,120 120,-119.09 -119.09,-119.09

## R-PQFP-N20 [mil]
pads (24):
  rrect50% 34x12 smd: 1(-87.99,-29.53) 10(88,-29.53) 11(88,30) 20(-87.99,30)
  rrect50% 12x34 smd: 2(-68.9,-68.9) 3(-49.21,-68.9) 4(-29.53,-68.9) 5(-9.84,-68.9) 6(10,-68.9) 7(30,-68.9) 8(50,-68.9) 9(69,-68.9) 12(69,69) 13(50,69) 14(30,69) 15(10,69) 16(-9.84,69) 17(-29.53,69) 18(-49.21,69) 19(-68.9,69)
  rect 121x81 smd: E@1(0,0)
  rect 152x20 smd: E@2(1,0)
  rect 209x10 smd: E@3(0,11) E@4(0,-10.83)
Top Paste:
  circle w0: c-76.38,30 r5
  circle w0: c-68.9,57 r5
  circle w0: c-49.21,57 r5
  circle w0: c-29.53,57 r5
  circle w0: c-9.84,57 r5
  circle w0: c10,57 r5
  circle w0: c30,57 r5
  circle w0: c50,57 r5
  circle w0: c69,57 r5
  circle w0: c77,30 r5
  circle w0: c77,-29.53 r5
  circle w0: c69,-56.69 r5
  circle w0: c50,-56.69 r5
  circle w0: c30,-56.69 r5
  circle w0: c10,-56.69 r5
  circle w0: c-9.84,-56.69 r5
  circle w0: c-29.53,-56.69 r5
  circle w0: c-49.21,-56.69 r5
  circle w0: c-68.9,-56.69 r5
  circle w0: c-76.38,-29.53 r5
  region: 104,16 68,16 68,7 104,7
  region: 104,-6.3 68,-6.3 68,-15.35 104,-15.35
  region: 58,39 6,39 6,6 58,6
  region: 58,-5.91 6,-5.91 6,-38.19 58,-38.19
  rectangle: -57.87,-38.19 -5.91,-5.91
  rectangle: -57.87,6 -5.91,39
  rectangle: -103.35,25 -76.38,35
  region: -73.4,83.98 -73.4,57.02 -64.4,57.02 -64.4,83.98
  region: -53.71,83.98 -53.71,57.02 -44.71,57.02 -44.71,83.98
  region: -34.03,83.98 -34.03,57.02 -25.03,57.02 -25.03,83.98
  region: -14.16,84.16 -14.16,56.84 -5.16,56.84 -5.16,84.16
  region: 5.68,84.32 5.68,56.68 14.68,56.68 14.68,84.32
  region: 26,84 26,57 35,57 35,84
  region: 45,84 45,57 54,57 54,84
  region: 65,84 65,57 74,57 74,84
  region: 104,35 77,35 77,25 104,25
  region: 104,-25 77,-25 77,-34.06 104,-34.06
  region: 74.03,-83.68 74.03,-56.68 64.97,-56.68 64.97,-83.68
  region: 54.03,-83.68 54.03,-56.68 44.97,-56.68 44.97,-83.68
  region: 35.03,-83.68 35.03,-56.68 25.97,-56.68 25.97,-83.68
  region: 14.71,-84 14.71,-56.36 5.65,-56.36 5.65,-84
  region: -5.14,-83.84 -5.14,-56.51 -14.19,-56.51 -14.19,-83.84
  region: -25,-83.66 -25,-56.69 -34.06,-56.69 -34.06,-83.66
  region: -44.69,-83.66 -44.69,-56.69 -53.74,-56.69 -53.74,-83.66
  region: -64.37,-83.66 -64.37,-56.69 -73.43,-56.69 -73.43,-83.66
  rectangle: -103.35,-34.06 -76.38,-25
  rectangle: -103.35,-15.35 -67.91,-6.3
  rectangle: -103.35,7 -67.91,16
Top Solder:
  circle w0: c-76.38,30 r9
  circle w0: c-68.9,57 r9
  circle w0: c-49.21,57 r9
  circle w0: c-29.53,57 r9
  circle w0: c-9.84,57 r9
  circle w0: c10,57 r9
  circle w0: c30,57 r9
  circle w0: c50,57 r9
  circle w0: c69,57 r9
  circle w0: c77,30 r9
  circle w0: c77,-29.53 r9
  circle w0: c69,-56.69 r9
  circle w0: c50,-56.69 r9
  circle w0: c30,-56.69 r9
  circle w0: c10,-56.69 r9
  circle w0: c-9.84,-56.69 r9
  circle w0: c-29.53,-56.69 r9
  circle w0: c-49.21,-56.69 r9
  circle w0: c-68.9,-56.69 r9
  circle w0: c-76.38,-29.53 r9
  region: 77,7 60,7 60,-6.89 77,-6.89
  rectangle: -76.77,-6.89 -59.06,7
  rectangle: -61.02,-41.34 62,42
  region: 106,16 60,16 60,6 106,6
  region: 106,-5.91 60,-5.91 60,-15.75 106,-15.75
  rectangle: -105.31,-15.75 -59.06,-5.91
  rectangle: -105.31,6 -59.06,16
  region: -108.13,38.27 -108.13,21.73 -76.13,21.73 -76.13,38.27
  region: -60.63,89 -77.17,89 -77.17,57 -60.63,57
  region: -40.94,89 -57.48,89 -57.48,57 -40.94,57
  region: -21.26,89 -37.8,89 -37.8,57 -21.26,57
  region: -1.57,89 -18.11,89 -18.11,57 -1.57,57
  region: 19,89 2,89 2,57 19,57
  region: 38,89 22,89 22,57 38,57
  region: 58,89 41,89 41,57 58,57
  region: 78,89 61,89 61,57 78,57
  region: 108.5,21.5 108.5,38.5 76.5,38.5 76.5,21.5
  region: 108.25,-38.03 108.25,-21.03 76.75,-21.03 76.75,-38.03
  rectangle: 61,-88.19 78,-56.69
  rectangle: 41,-88.19 58,-56.69
  rectangle: 22,-88.19 38,-56.69
  rectangle: 2,-88.19 19,-56.69
  rectangle: -18.11,-88.19 -1.57,-56.69
  rectangle: -37.8,-88.19 -21.26,-56.69
  rectangle: -57.48,-88.19 -40.94,-56.69
  rectangle: -77.17,-88.19 -60.63,-56.69
  region: -107.87,-21.26 -107.87,-37.8 -76.38,-37.8 -76.38,-21.26
Mechanical 4:
  rectangle: -87.2,-67.91 0,0
  lines w8: -87.6,-67.91 -87.6,68 88,68 88,-67.91 -87.6,-67.91

## R-PSOP-G24 [mil]
pads (24):
  rect 14x40 smd: 1(-140.75,-141.73) 2(-115.16,-141.73) 3(-89.57,-141.73) 4(-63.98,-141.73) 5(-38.39,-141.73) 6(-12.8,-141.73) 7(13,-141.73) 8(39,-141.73) 9(64,-141.73) 10(90,-141.73) 11(116,-141.73) 12(141,-141.73) 13(141,142) 14(116,142) 15(90,142) 16(64,142) 17(39,142) 18(13,142) 19(-12.8,142) 20(-38.39,142) 21(-63.98,142) 22(-89.57,142) 23(-115.16,142) 24(-140.75,142)
Top Overlay:
  circle w8: c-120.08,-78.74 r13
  lines w8: -157.48,-114.17 -157.48,115 158,115 158,-114.17 -157.48,-114.17
Mechanical 4:
  region: -134.84,154 -146.65,154 -146.65,118 -134.84,118
  region: -109.25,154 -121.06,154 -121.06,118 -109.25,118
  region: -83.66,154 -95.47,154 -95.47,118 -83.66,118
  region: -58.07,154 -69.88,154 -69.88,118 -58.07,118
  region: -32.48,154 -44.29,154 -44.29,118 -32.48,118
  region: -6.89,154 -18.7,154 -18.7,118 -6.89,118
  region: 19,154 7,154 7,118 19,118
  region: 45,154 33,154 33,118 45,118
  region: 70,154 59,154 59,118 70,118
  region: 96,154 84,154 84,118 96,118
  region: 122,154 110,154 110,118 122,118
  region: 147,154 135,154 135,118 147,118
  rectangle: 135,-153.54 147,-117.13
  rectangle: 110,-153.54 122,-117.13
  rectangle: 84,-153.54 96,-117.13
  rectangle: 59,-153.54 70,-117.13
  rectangle: 33,-153.54 45,-117.13
  rectangle: 7,-153.54 19,-117.13
  rectangle: -18.7,-153.54 -6.89,-117.13
  rectangle: -44.29,-153.54 -32.48,-117.13
  rectangle: -69.88,-153.54 -58.07,-117.13
  rectangle: -95.47,-153.54 -83.66,-117.13
  rectangle: -121.06,-153.54 -109.25,-117.13
  rectangle: -146.65,-153.54 -134.84,-117.13